# Altium footprint library Custom2.PcbLib: 99 footprints (part 1 of 7)
Each footprint in its own frame and in the unit in brackets; x right, y up, seen from the top. Pads: shape width x height; smd on the part's side, far side on the other; paste and mask are expansions set on the pad; w line width, h text height; cw(c..) or ccw(c..) is an arc to the next point about the centre after c.
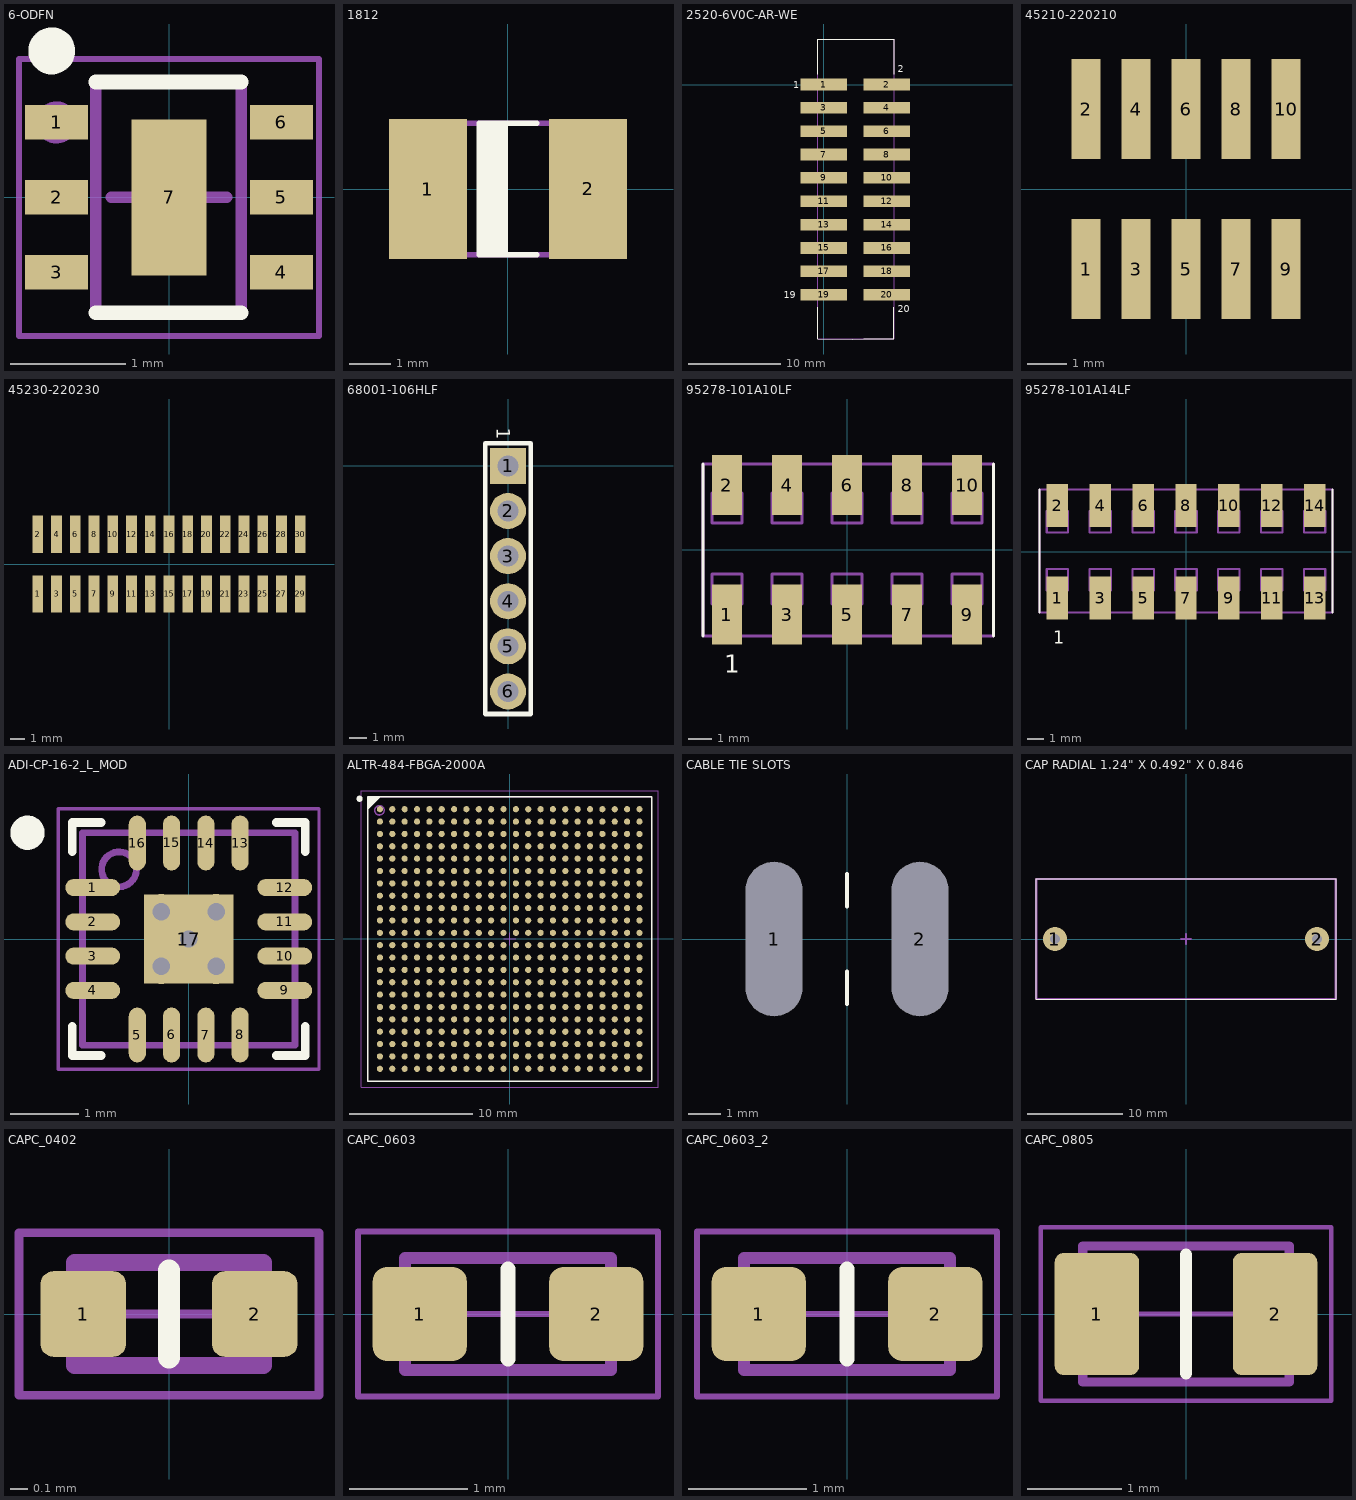
[diagram p0: the footprints below, top view; thin cyan lines are the x and y axes]

## 6-ODFN [mm]
pads (7):
  rect 0.55x0.3 smd: 1(-0.975,0.65) 2(-0.975,0) 3(-0.975,-0.65) 4(0.975,-0.65) 5(0.975,0) 6(0.975,0.65)
  rect 0.65x1.35 smd: 7(0,0)
Top Overlay:
  circle w0.254: c-1.016,1.27 r0.076
  lines w0.127: -0.635,-1 0.625,-1 ; -0.635,1 0.625,1
Mechanical 13:
  circle w0.127: c-0.975,0.65 r0.119
  lines w0.1: -0.635,-1 0.625,-1 0.625,1 -0.635,1 -0.635,-1
  text "'.Designator'" at -2.388,1.194 h0.76
Mechanical 15:
  lines w0.05: -1.3,-1.2 1.3,-1.2 1.3,1.2 -1.3,1.2 -1.3,-1.2
  lines w0.1: -0.5,0 0.5,0 ; 0,-0.5 0,0.5
3D body: height 0.81, standoff 0.79, extent -0.813,0.483 -0.508,0.786
3D body "DFN-6-1.step": height 0.81, standoff 0.01, extent -1.05,-1 1.05,1

## 1812 [mm]
pads (2):
  rect 1.9x3.4 smd: 1(-1.95,0) 2(1.95,0)
Top Overlay:
  rectangle: -0.7,-1.6 0,1.6
  lines w0.127: -0.51,-1.6 -0.51,1.6 ; 0.7,-1.6 -0.7,-1.6 -0.7,1.6 0.7,1.6
Mechanical 13:
  lines w0.127: -1.677,1.6 -1.677,-1.598 -1.675,-1.6 ; -2.225,-1.6 2.225,-1.6 ; -2.225,-1.6 -2.225,-1.6 ; -2.225,-1.6 -2.225,1.6 ; -2.225,1.6 2.225,1.6 ; -2.225,1.6 -2.225,1.6 ; 2.225,-1.6 2.225,1.6 ; 2.225,-1.6 2.225,-1.6 ; 2.225,1.6 2.225,1.6
  text "'.Designator'" at -1.162,-0.542 h0.76
3D body: height 1.8, standoff 0, extent -1.677,-1.6 -1.3,1.6
3D body: height 1.8, standoff 0, extent 1.675,-1.6 2.225,1.6
3D body: height 1.8, standoff 0, extent -1.3,-1.6 -0.95,1.6
3D body: height 1.8, standoff 0, extent -0.95,-1.6 1.675,1.6
3D body: height 1.8, standoff 0, extent -2.225,-1.6 -1.675,1.6

## 2520-6V0C-AR-WE [mil]
pads (20):
  rect 200x50 smd: 1(0,0) 2(270,0) 3(0,-100) 4(270,-100) 5(0,-200) 6(270,-200) 7(0,-300) 8(270,-300) 9(0,-400) 10(270,-400) 11(0,-500) 12(270,-500) 13(0,-600) 14(270,-600) 15(0,-700) 16(270,-700) 17(0,-800) 18(270,-800) 19(0,-900) 20(270,-900)
Top Overlay:
  lines w5: -25,-953 -25,-1050 -25,-1090 124.38,-1090 171.25,-1090 300,-1090 300,-953 ; -25,45 -25,195 300,195 300,45
  text "1" at -130,-15 h30
  text "2" at 317.53,51.54 h30
  text "19" at -170,-915 h30
  text "20" at 316.6,-976.35 h30
Mechanical 13:
  lines w5: -25,-1090 300,-1090 300,195 -25,195 -25,-1090
  text "'.Designator'" at 120,-315 h30
  text "20" at 340,-915 h30
  text "19" at -105,-915 h30
  text "2" at 340,-15 h30
  text "1" at -65,-15 h30
3D body: height 390, standoff 0, extent -105,150 -105,150
3D body "2520-6V0C-XX_STEP.stp": height 400.5, standoff 0.5, extent -80,-1093 360,195

## 45210-220210 [mil] "Shrouded header, 5x2, 452 series, through hole"
pads (10):
  rect 29x100 smd: 1(-100,-80) 2(-100,80) 3(-50,-80) 4(-50,80) 5(0,-80) 6(0,80) 7(50,-80) 8(50,80) 9(100,-80) 10(100,80)
Top Layer:
Mechanical 13:
  text "'.Designator'" at -205,-10 h30
3D body "45210-2X02.stp": height 222.3, standoff 0, extent -210,-115 210,115

## 45230-220230 [mil] "Shrouded header, 5x2, 452 series, through hole"
pads (30):
  rect 29x100 smd: 1(-350,-80) 2(-350,80) 3(-300,-80) 4(-300,80) 5(-250,-80) 6(-250,80) 7(-200,-80) 8(-200,80) 9(-150,-80) 10(-150,80) 11(-100,-80) 12(-100,80) 13(-50,-80) 14(-50,80) 15(0,-80) 16(0,80) 17(50,-80) 18(50,80) 19(100,-80) 20(100,80) 21(150,-80) 22(150,80) 23(200,-80) 24(200,80) 25(250,-80) 26(250,80) 27(300,-80) 28(300,80) 29(350,-80) 30(350,80)
Top Layer:
Mechanical 13:
  text "'.Designator'" at -190,-10 h30
3D body "45230-220230.STEP": height 271.9, standoff -0.24, extent -720.55,-115 720.55,115

## 68001-106HLF [mil]
pads (6):
  rect 80x80 hole 46 paste+0: 1(0,0)
  round 80 hole 46 paste+0: 2(0,-100) 3(0,-200) 4(0,-300) 5(0,-400) 6(0,-500)
Top Overlay:
  lines w10: -50,-550 -50,50 50,50 50,-550 -50,-550
  text "1" at -25,85 h30
Mechanical 13:
  lines w6: -50,-550 -50,50 50,50 50,-550 -50,-550
  text ".Designator" at -15,-100 h50
3D body: height 300, standoff 0, extent -15,-515 15,-485
3D body: height 300, standoff 0, extent -15,-415 15,-385
3D body: height 300, standoff 0, extent -15,-315 15,-285
3D body: height 300, standoff 0, extent -15,-215 15,-185
3D body: height 300, standoff 0, extent -15,-115 15,-85
3D body: height 300, standoff 0, extent -15,-15 15,15
3D body: height 50, standoff 0, extent -50,-550 50,50
3D body: height 300, standoff 0, extent -15,-15 15,15
3D body: height 300, standoff 0, extent -15,-115 15,-85
3D body: height 300, standoff 0, extent -15,-215 15,-185
3D body: height 300, standoff 0, extent -15,-315 15,-285

## 95278-101A10LF [mil]
pads (10):
  rect 50x100 smd: 1(-200.01,-108) 2(-200.01,108) 3(-100.01,-108) 4(-100.01,108) 5(-0.01,-108) 6(-0.01,108) 7(99.99,-108) 8(99.99,108) 9(199.99,-108) 10(199.99,108)
Top Overlay:
  lines w5: -240,-143.43 -240,143.43 ; 244.25,-143.43 244.25,143.43
  text "1" at -205,-205 h30
Mechanical 13:
  lines w5: -240,-143.43 -240,143.43 244.25,143.43 244.25,-143.43 -240,-143.43 ; -225,-90 -225,-40 -175,-40 -175,-90 -225,-90 ; -225,45 -175,45 -175,95 -225,95 -225,45 ; -125,-90 -75,-90 -75,-40 -125,-40 -125,-90 ; -125,45 -75,45 -75,95 -125,95 -125,45 ; -25,-90 -25,-40 25,-40 25,-90 -25,-90 ; -25,45 -25,95 25,95 25,45 -25,45 ; 75,-90 125,-90 125,-40 75,-40 75,-90 ; 75,45 125,45 125,95 75,95 75,45 ; 175,-90 225,-90 225,-40 175,-40 175,-90 ; 175,45 175,95 225,95 225,45 175,45
  text "1" at -205,-185 h30
  text "'.Designator'" at -39,-22 h30
3D body "95278_y01_10_asm.stp": height 380.88, standoff 0.5, extent -240,-143.43 244.25,143.43

## 95278-101A14LF [mil]
pads (14):
  rect 50x100 smd: 1(-300.01,-108) 2(-300.01,108) 3(-200.01,-108) 4(-200.01,108) 5(-100.01,-108) 6(-100.01,108) 7(-0.01,-108) 8(-0.01,108) 9(99.99,-108) 10(99.99,108) 11(200.01,-108) 12(200.01,108) 13(300.01,-108) 14(300.01,108)
Top Overlay:
  lines w5: -342.13,145 -342.12,-141.85 ; 342.13,-141.85 342.13,145
  text "1" at -310,-215 h30
Mechanical 13:
  lines w5: 342.13,145 342.13,-141.85 -342.12,-141.85 -342.12,145 -342.13,145 342.13,145 ; 342.13,145 342.13,145 ; -325,-90 -275,-90 -275,-40 -325,-40 -325,-90 ; -325,45 -325,95 -275,95 -275,45 -325,45 ; -225,-90 -225,-40 -175,-40 -175,-90 -225,-90 ; -225,45 -175,45 -175,95 -225,95 -225,45 ; -125,-90 -75,-90 -75,-40 -125,-40 -125,-90 ; -125,45 -75,45 -75,95 -125,95 -125,45 ; -25,-90 -25,-40 25,-40 25,-90 -25,-90 ; -25,45 -25,95 25,95 25,45 -25,45 ; 75,-90 125,-90 125,-40 75,-40 75,-90 ; 75,45 125,45 125,95 75,95 75,45 ; 175,-90 225,-90 225,-40 175,-40 175,-90 ; 175,45 175,95 225,95 225,45 175,45 ; 275,-90 325,-90 325,-40 275,-40 275,-90 ; 275,45 275,95 325,95 325,45 275,45
  text "1" at -310,-215 h30
  text "'.Designator'" at -95,-25 h30
3D body "95278_y01_14_asm.stp": height 380.88, standoff 0.5, extent -342.12,-141.85 342.13,145

## ADI-CP-16-2_L_MOD [mm]
pads (17):
  oval 0.8x0.25 smd mask+0.08: 1(-1.4,0.75) 2(-1.4,0.25) 3(-1.4,-0.25) 4(-1.4,-0.75) 9(1.4,-0.75) 10(1.4,-0.25) 11(1.4,0.25) 12(1.4,0.75)
  oval 0.25x0.8 smd mask+0.08: 5(-0.75,-1.4) 6(-0.25,-1.4) 7(0.25,-1.4) 8(0.75,-1.4) 13(0.75,1.4) 14(0.25,1.4) 15(-0.25,1.4) 16(-0.75,1.4)
  rect 1.3x1.3 smd paste-0.66: 17(0,0)
via -0.4,-0.4 diameter 0.508 hole 0.254
via 0.4,-0.4 diameter 0.508 hole 0.254
via 0.4,0.4 diameter 0.508 hole 0.254
via -0.4,0.4 diameter 0.508 hole 0.254
via 0,0 diameter 0.508 hole 0.254
Top Overlay:
  circle w0.25: c-2.35,1.55 r0.125
  lines w0.127: -1.7,-1.275 -1.7,-1.7 -1.275,-1.7 ; -1.7,1.275 -1.7,1.7 -1.275,1.7 ; 1.275,-1.7 1.7,-1.7 1.7,-1.275 ; 1.275,1.7 1.7,1.7 1.7,1.275
Top Paste:
  circle w0.254: c0.4,0 r0.12
  circle w0.254: c0,-0.4 r0.127
  circle w0.254: c0,0.4 r0.127
  circle w0.254: c-0.4,0 r0.127
Mechanical 13:
  circle w0.1: c-1.016,1.016 r0.254
  lines w0.1: -1.55,-1.55 -1.55,1.55 1.55,1.55 1.55,-1.55 -1.55,-1.55
  text "'.Designator'" at -0.279,0.559 h0.76
Mechanical 15:
  lines w0.05: -1.9,-1.9 -1.9,1.9 1.9,1.9 1.9,-1.9 -1.9,-1.9
  lines w0.1: -0.5,0 0.5,0 ; 0,-0.5 0,0.5
3D body: height 1.02, standoff 0.99, extent -1.32,0.815 -0.813,1.321
3D body: height 1, standoff 0, extent -1.55,-1.55 1.55,1.55

## ALTR-484-FBGA-2000A [mm]
pads (484):
  round 0.5 smd: A1(-10.5,10.5) A2(-9.5,10.5) A3(-8.5,10.5) A4(-7.5,10.5) A5(-6.5,10.5) A6(-5.5,10.5) A7(-4.5,10.5) A8(-3.5,10.5) A9(-2.5,10.5) A10(-1.5,10.5) A11(-0.5,10.5) A12(0.5,10.5) A13(1.5,10.5) A14(2.5,10.5) A15(3.5,10.5) A16(4.5,10.5) A17(5.5,10.5) A18(6.5,10.5) A19(7.5,10.5) A20(8.5,10.5) A21(9.5,10.5) A22(10.5,10.5) AA1(-10.5,-9.5) AA2(-9.5,-9.5) AA3(-8.5,-9.5) AA4(-7.5,-9.5) AA5(-6.5,-9.5) AA6(-5.5,-9.5) AA7(-4.5,-9.5) AA8(-3.5,-9.5) AA9(-2.5,-9.5) AA10(-1.5,-9.5) AA11(-0.5,-9.5) AA12(0.5,-9.5) AA13(1.5,-9.5) AA14(2.5,-9.5) AA15(3.5,-9.5) AA16(4.5,-9.5) AA17(5.5,-9.5) AA18(6.5,-9.5) AA19(7.5,-9.5) AA20(8.5,-9.5) AA21(9.5,-9.5) AA22(10.5,-9.5) AB1(-10.5,-10.5) AB2(-9.5,-10.5) AB3(-8.5,-10.5) AB4(-7.5,-10.5) AB5(-6.5,-10.5) AB6(-5.5,-10.5) AB7(-4.5,-10.5) AB8(-3.5,-10.5) AB9(-2.5,-10.5) AB10(-1.5,-10.5) AB11(-0.5,-10.5) AB12(0.5,-10.5) AB13(1.5,-10.5) AB14(2.5,-10.5) AB15(3.5,-10.5) AB16(4.5,-10.5) AB17(5.5,-10.5) AB18(6.5,-10.5) AB19(7.5,-10.5) AB20(8.5,-10.5) AB21(9.5,-10.5) AB22(10.5,-10.5) B1(-10.5,9.5) B2(-9.5,9.5) B3(-8.5,9.5) B4(-7.5,9.5) B5(-6.5,9.5) B6(-5.5,9.5) B7(-4.5,9.5) B8(-3.5,9.5) B9(-2.5,9.5) B10(-1.5,9.5) B11(-0.5,9.5) B12(0.5,9.5) B13(1.5,9.5) B14(2.5,9.5) B15(3.5,9.5) B16(4.5,9.5) B17(5.5,9.5) B18(6.5,9.5) B19(7.5,9.5) B20(8.5,9.5) B21(9.5,9.5) B22(10.5,9.5) C1(-10.5,8.5) C2(-9.5,8.5) C3(-8.5,8.5) C4(-7.5,8.5) C5(-6.5,8.5) C6(-5.5,8.5) C7(-4.5,8.5) C8(-3.5,8.5) C9(-2.5,8.5) C10(-1.5,8.5) C11(-0.5,8.5) C12(0.5,8.5) C13(1.5,8.5) C14(2.5,8.5) C15(3.5,8.5) C16(4.5,8.5) C17(5.5,8.5) C18(6.5,8.5) C19(7.5,8.5) C20(8.5,8.5) C21(9.5,8.5) C22(10.5,8.5) D1(-10.5,7.5) D2(-9.5,7.5) D3(-8.5,7.5) D4(-7.5,7.5) D5(-6.5,7.5) D6(-5.5,7.5) D7(-4.5,7.5) D8(-3.5,7.5) D9(-2.5,7.5) D10(-1.5,7.5) D11(-0.5,7.5) D12(0.5,7.5) D13(1.5,7.5) D14(2.5,7.5) D15(3.5,7.5) D16(4.5,7.5) D17(5.5,7.5) D18(6.5,7.5) D19(7.5,7.5) D20(8.5,7.5) D21(9.5,7.5) D22(10.5,7.5) E1(-10.5,6.5) E2(-9.5,6.5) E3(-8.5,6.5) E4(-7.5,6.5) E5(-6.5,6.5) E6(-5.5,6.5) E7(-4.5,6.5) E8(-3.5,6.5) E9(-2.5,6.5) E10(-1.5,6.5) E11(-0.5,6.5) E12(0.5,6.5) E13(1.5,6.5) E14(2.5,6.5) E15(3.5,6.5) E16(4.5,6.5) E17(5.5,6.5) E18(6.5,6.5) E19(7.5,6.5) E20(8.5,6.5) E21(9.5,6.5) E22(10.5,6.5) F1(-10.5,5.5) F2(-9.5,5.5) F3(-8.5,5.5) F4(-7.5,5.5) F5(-6.5,5.5) F6(-5.5,5.5) F7(-4.5,5.5) F8(-3.5,5.5) F9(-2.5,5.5) F10(-1.5,5.5) F11(-0.5,5.5) F12(0.5,5.5) F13(1.5,5.5) F14(2.5,5.5) F15(3.5,5.5) F16(4.5,5.5) F17(5.5,5.5) F18(6.5,5.5) F19(7.5,5.5) F20(8.5,5.5) F21(9.5,5.5) F22(10.5,5.5) G1(-10.5,4.5) G2(-9.5,4.5) G3(-8.5,4.5) G4(-7.5,4.5) G5(-6.5,4.5) G6(-5.5,4.5) G7(-4.5,4.5) G8(-3.5,4.5) G9(-2.5,4.5) G10(-1.5,4.5) G11(-0.5,4.5) G12(0.5,4.5) G13(1.5,4.5) G14(2.5,4.5) G15(3.5,4.5) G16(4.5,4.5) G17(5.5,4.5) G18(6.5,4.5) G19(7.5,4.5) G20(8.5,4.5) G21(9.5,4.5) G22(10.5,4.5) H1(-10.5,3.5) H2(-9.5,3.5) H3(-8.5,3.5) H4(-7.5,3.5) H5(-6.5,3.5) H6(-5.5,3.5) H7(-4.5,3.5) H8(-3.5,3.5) H9(-2.5,3.5) H10(-1.5,3.5) H11(-0.5,3.5) H12(0.5,3.5) H13(1.5,3.5) H14(2.5,3.5) H15(3.5,3.5) H16(4.5,3.5) H17(5.5,3.5) H18(6.5,3.5) H19(7.5,3.5) H20(8.5,3.5) H21(9.5,3.5) H22(10.5,3.5) J1(-10.5,2.5) J2(-9.5,2.5) J3(-8.5,2.5) J4(-7.5,2.5) J5(-6.5,2.5) J6(-5.5,2.5) J7(-4.5,2.5) J8(-3.5,2.5) J9(-2.5,2.5) J10(-1.5,2.5) J11(-0.5,2.5) J12(0.5,2.5) J13(1.5,2.5) J14(2.5,2.5) J15(3.5,2.5) J16(4.5,2.5) J17(5.5,2.5) J18(6.5,2.5) J19(7.5,2.5) J20(8.5,2.5) J21(9.5,2.5) J22(10.5,2.5) K1(-10.5,1.5) K2(-9.5,1.5) K3(-8.5,1.5) K4(-7.5,1.5) K5(-6.5,1.5) K6(-5.5,1.5) K7(-4.5,1.5) K8(-3.5,1.5) K9(-2.5,1.5) K10(-1.5,1.5) K11(-0.5,1.5) K12(0.5,1.5) K13(1.5,1.5) K14(2.5,1.5) K15(3.5,1.5) K16(4.5,1.5) K17(5.5,1.5) K18(6.5,1.5) K19(7.5,1.5) K20(8.5,1.5) K21(9.5,1.5) K22(10.5,1.5) L1(-10.5,0.5) L2(-9.5,0.5) L3(-8.5,0.5) L4(-7.5,0.5) L5(-6.5,0.5) L6(-5.5,0.5) L7(-4.5,0.5) L8(-3.5,0.5) L9(-2.5,0.5) L10(-1.5,0.5) L11(-0.5,0.5) L12(0.5,0.5) L13(1.5,0.5) L14(2.5,0.5) L15(3.5,0.5) L16(4.5,0.5) L17(5.5,0.5) L18(6.5,0.5) L19(7.5,0.5) L20(8.5,0.5) L21(9.5,0.5) L22(10.5,0.5) M1(-10.5,-0.5) M2(-9.5,-0.5) M3(-8.5,-0.5) M4(-7.5,-0.5) M5(-6.5,-0.5) M6(-5.5,-0.5) M7(-4.5,-0.5) M8(-3.5,-0.5) M9(-2.5,-0.5) M10(-1.5,-0.5) M11(-0.5,-0.5) M12(0.5,-0.5) M13(1.5,-0.5) M14(2.5,-0.5) M15(3.5,-0.5) M16(4.5,-0.5) M17(5.5,-0.5) M18(6.5,-0.5) M19(7.5,-0.5) M20(8.5,-0.5) M21(9.5,-0.5) M22(10.5,-0.5) N1(-10.5,-1.5) N2(-9.5,-1.5) N3(-8.5,-1.5) N4(-7.5,-1.5) N5(-6.5,-1.5) N6(-5.5,-1.5) N7(-4.5,-1.5) N8(-3.5,-1.5) N9(-2.5,-1.5) N10(-1.5,-1.5) N11(-0.5,-1.5) N12(0.5,-1.5) N13(1.5,-1.5) N14(2.5,-1.5) N15(3.5,-1.5) N16(4.5,-1.5) N17(5.5,-1.5) N18(6.5,-1.5) N19(7.5,-1.5) N20(8.5,-1.5) N21(9.5,-1.5) N22(10.5,-1.5) P1(-10.5,-2.5) P2(-9.5,-2.5) P3(-8.5,-2.5) P4(-7.5,-2.5) P5(-6.5,-2.5) P6(-5.5,-2.5) P7(-4.5,-2.5) P8(-3.5,-2.5) P9(-2.5,-2.5) P10(-1.5,-2.5) P11(-0.5,-2.5) P12(0.5,-2.5) P13(1.5,-2.5) P14(2.5,-2.5) P15(3.5,-2.5) P16(4.5,-2.5) P17(5.5,-2.5) P18(6.5,-2.5) P19(7.5,-2.5) P20(8.5,-2.5) P21(9.5,-2.5) P22(10.5,-2.5) R1(-10.5,-3.5) R2(-9.5,-3.5) R3(-8.5,-3.5) R4(-7.5,-3.5) R5(-6.5,-3.5) R6(-5.5,-3.5) R7(-4.5,-3.5) R8(-3.5,-3.5) R9(-2.5,-3.5) R10(-1.5,-3.5) R11(-0.5,-3.5) R12(0.5,-3.5) R13(1.5,-3.5) R14(2.5,-3.5) R15(3.5,-3.5) R16(4.5,-3.5) R17(5.5,-3.5) R18(6.5,-3.5) R19(7.5,-3.5) R20(8.5,-3.5) R21(9.5,-3.5) R22(10.5,-3.5) T1(-10.5,-4.5) T2(-9.5,-4.5) T3(-8.5,-4.5) T4(-7.5,-4.5) T5(-6.5,-4.5) T6(-5.5,-4.5) T7(-4.5,-4.5) T8(-3.5,-4.5) T9(-2.5,-4.5) T10(-1.5,-4.5) T11(-0.5,-4.5) T12(0.5,-4.5) T13(1.5,-4.5) T14(2.5,-4.5) T15(3.5,-4.5) T16(4.5,-4.5) T17(5.5,-4.5) T18(6.5,-4.5) T19(7.5,-4.5) T20(8.5,-4.5) T21(9.5,-4.5) T22(10.5,-4.5) U1(-10.5,-5.5) U2(-9.5,-5.5) U3(-8.5,-5.5) U4(-7.5,-5.5) U5(-6.5,-5.5) U6(-5.5,-5.5) U7(-4.5,-5.5) U8(-3.5,-5.5) U9(-2.5,-5.5) U10(-1.5,-5.5) U11(-0.5,-5.5) U12(0.5,-5.5) U13(1.5,-5.5) U14(2.5,-5.5) U15(3.5,-5.5) U16(4.5,-5.5) U17(5.5,-5.5) U18(6.5,-5.5) U19(7.5,-5.5) U20(8.5,-5.5) U21(9.5,-5.5) U22(10.5,-5.5) V1(-10.5,-6.5) V2(-9.5,-6.5) V3(-8.5,-6.5) V4(-7.5,-6.5) V5(-6.5,-6.5) V6(-5.5,-6.5) V7(-4.5,-6.5) V8(-3.5,-6.5) V9(-2.5,-6.5) V10(-1.5,-6.5) V11(-0.5,-6.5) V12(0.5,-6.5) V13(1.5,-6.5) V14(2.5,-6.5) V15(3.5,-6.5) V16(4.5,-6.5) V17(5.5,-6.5) V18(6.5,-6.5) V19(7.5,-6.5) V20(8.5,-6.5) V21(9.5,-6.5) V22(10.5,-6.5) W1(-10.5,-7.5) W2(-9.5,-7.5) W3(-8.5,-7.5) W4(-7.5,-7.5) W5(-6.5,-7.5) W6(-5.5,-7.5) W7(-4.5,-7.5) W8(-3.5,-7.5) W9(-2.5,-7.5) W10(-1.5,-7.5) W11(-0.5,-7.5) W12(0.5,-7.5) W13(1.5,-7.5) W14(2.5,-7.5) W15(3.5,-7.5) W16(4.5,-7.5) W17(5.5,-7.5) W18(6.5,-7.5) W19(7.5,-7.5) W20(8.5,-7.5) W21(9.5,-7.5) W22(10.5,-7.5) Y1(-10.5,-8.5) Y2(-9.5,-8.5) Y3(-8.5,-8.5) Y4(-7.5,-8.5) Y5(-6.5,-8.5) Y6(-5.5,-8.5) Y7(-4.5,-8.5) Y8(-3.5,-8.5) Y9(-2.5,-8.5) Y10(-1.5,-8.5) Y11(-0.5,-8.5) Y12(0.5,-8.5) Y13(1.5,-8.5) Y14(2.5,-8.5) Y15(3.5,-8.5) Y16(4.5,-8.5) Y17(5.5,-8.5) Y18(6.5,-8.5) Y19(7.5,-8.5) Y20(8.5,-8.5) Y21(9.5,-8.5) Y22(10.5,-8.5)
Top Overlay:
  circle w0.25: c-12.15,11.35 r0.125
  region: -10.5,11.5 -11.5,10.5 -11.5,11.5
  lines w0.127: -11.5,10.5 -10.5,11.5 ; -11.5,-11.5 -11.5,11.5 11.5,11.5 11.5,-11.5 -11.5,-11.5
Mechanical 13:
  circle w0.127: c-10.541,10.414 r0.381
  lines w0.1: -11.5,-11.5 -11.5,11.5 11.5,11.5 11.5,-11.5 -11.5,-11.5
  text "'.Designator'" at -2.772,-0.549 h0.76
Mechanical 15:
  lines w0.05: -12,-12 -12,12 12,12 12,-12 -12,-12
  lines w0.1: -0.5,0 0.5,0 ; 0,-0.5 0,0.5
3D body: height 2, standoff 0.4, extent -11.5,-11.5 11.5,11.5
3D body: height 2.01, standoff 1.98, extent -10.92,10.288 -10.414,10.795

## CABLE TIE SLOTS [mil]
pads (2):
  round 60 hole 70 slot 190 at 90 deg unplated mask+4: 1(-90,0) 2(90,0)
Top Overlay:
  lines w5: 0,-80 0,-40 ; 0,40 0,80
3D body: height 125, standoff 0, extent -60,-85.5 60,85.51

## CAP RADIAL 1.24" X 0.492" X 0.846 [mil]
pads (2):
  round 100 hole 40: 1(-541.5,0) 2(541.5,0)
Top Overlay:
  lines w5: -620,-250 -620,250 620,250 620,-250 -620,-250
Mechanical 13:
  lines w5: -620,-250 -620,250 620,250 620,-250 -620,-250
  text "'.Designator'" at 48.15,1.37 h30
Mechanical 15:
  lines w10: -19.68,0 19.68,0 ; 0,-19.68 0,19.68 ; -618.11,-248.03 618.11,-248.03 618.11,248.03 -618.11,248.03 -618.11,-248.03
3D body: height 846, standoff 20, extent -616.5,-245 618.5,245

## CAPC_0402 [mm]
pads (2):
  rrect30% 0.5x0.5 smd: 1(-0.5,0) 2(0.5,0)
Top Overlay:
  lines w0.127: 0,-0.254 0,0.254
Mechanical 13:
  lines w0.1: -0.55,-0.3 -0.55,0.3 0.55,0.3 0.55,-0.3 -0.55,-0.3
  text "'.Designator'" at 0.762,-0.635 h0.64
Mechanical 15:
  lines w0.05: -0.3,0 0.3,0 ; 0,-0.3 0,0.3 ; -0.875,-0.475 -0.875,0.475 0.875,0.475 0.875,-0.475 -0.875,-0.475
3D body: height 0.6, standoff 0, extent -0.55,-0.3 0.55,0.3

## CAPC_0603 [mm]
pads (2):
  rrect30% 0.8x0.8 smd: 1(-0.75,0) 2(0.75,0)
Top Overlay:
  lines w0.127: 0,-0.381 0,0.381
Mechanical 13:
  lines w0.1: -0.875,-0.475 0.875,-0.475 0.875,0.475 -0.875,0.475 -0.875,-0.475
  text "'.Designator'" at -1.27,0.457 h0.76
Mechanical 15:
  lines w0.05: -0.475,0 0.475,0 ; 0,-0.475 0,0.475 ; -1.275,-0.7 1.275,-0.7 1.275,0.7 -1.275,0.7 -1.275,-0.7
3D body: height 0.85, standoff 0, extent -0.875,-0.475 0.875,0.475

## CAPC_0603_2 [mm]
pads (2):
  rrect30% 0.8x0.8 smd: 1(-0.75,0) 2(0.75,0)
Top Overlay:
  lines w0.127: 0,-0.381 0,0.381
Mechanical 13:
  lines w0.1: -0.875,-0.475 -0.875,0.475 0.875,0.475 0.875,-0.475 -0.875,-0.475
  text "'.Designator'" at -4.089,-0.584 h0.76
Mechanical 15:
  lines w0.05: -0.475,0 0.475,0 ; 0,-0.475 0,0.475 ; -1.275,-0.7 -1.275,0.7 1.275,0.7 1.275,-0.7 -1.275,-0.7
3D body: height 0.85, standoff 0, extent -0.875,-0.475 0.875,0.475

## CAPC_0805 [mm]
pads (2):
  rrect20% 0.9x1.3 smd: 1(-0.95,0) 2(0.95,0)
Top Overlay:
  lines w0.127: 0,-0.635 0,0.635
Mechanical 13:
  lines w0.1: -1.1,-0.725 1.1,-0.725 1.1,0.725 -1.1,0.725 -1.1,-0.725
  text "'.Designator'" at 4.42,0.483 h0.76
Mechanical 15:
  lines w0.05: -0.5,0 0.5,0 ; 0,-0.5 0,0.5 ; -1.55,-0.925 1.55,-0.925 1.55,0.925 -1.55,0.925 -1.55,-0.925
3D body: height 1.1, standoff 0, extent -1.1,-0.725 1.1,0.725